# Altium footprint library IDETEC.PcbLib: 275 footprints (part 6 of 18)
Each footprint in its own frame and in the unit in brackets; x right, y up, seen from the top. Pads: shape width x height; smd on the part's side, far side on the other; paste and mask are expansions set on the pad; w line width, h text height; cw(c..) or ccw(c..) is an arc to the next point about the centre after c.
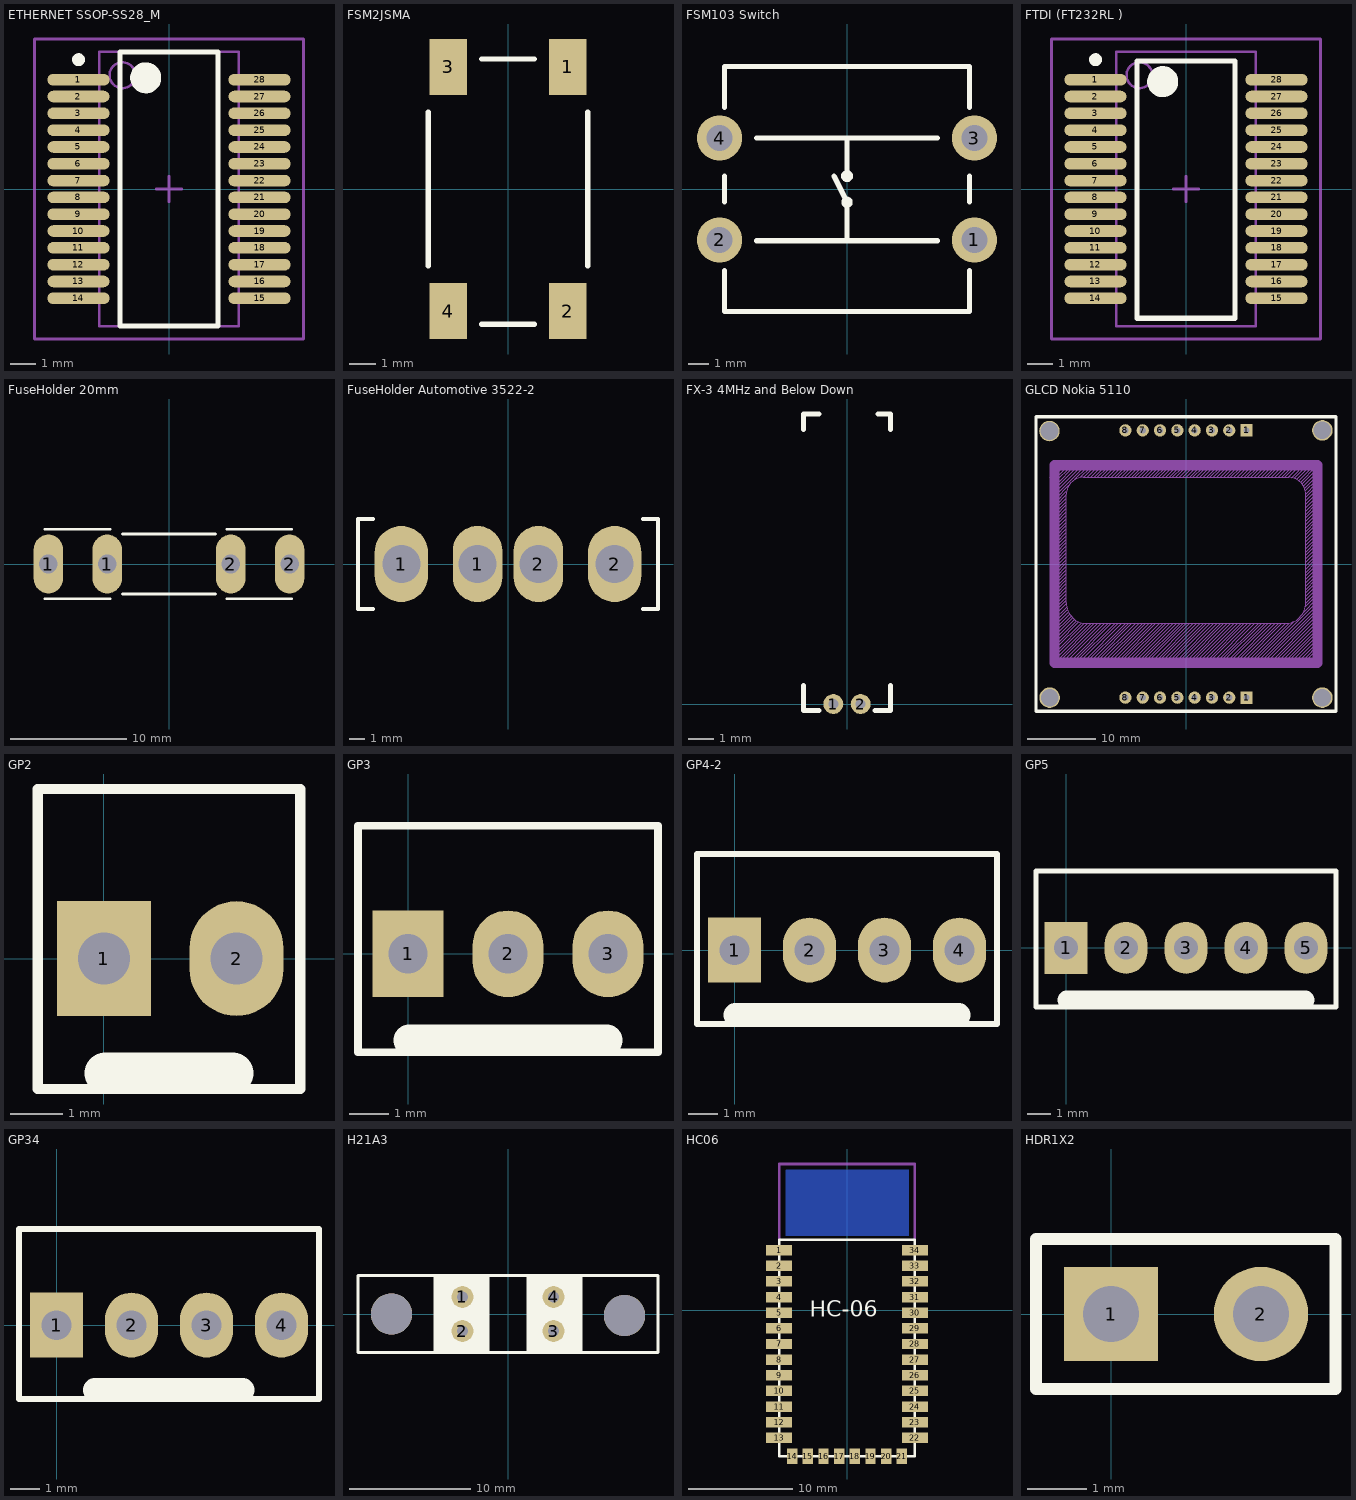
[diagram p5: the footprints below, top view; thin cyan lines are the x and y axes]

## ETHERNET SSOP-SS28_M [mm] "SOP, 28-Leads, Body 10.2x5.2mm, Pitch 0.65mm, IPC Low Density"
height 2
pads (28):
  oval 2.4x0.45 smd: 1(-3.5,4.225) 2(-3.5,3.575) 3(-3.5,2.925) 4(-3.5,2.275) 5(-3.5,1.625) 6(-3.5,0.975) 7(-3.5,0.325) 8(-3.5,-0.325) 9(-3.5,-0.975) 10(-3.5,-1.625) 11(-3.5,-2.275) 12(-3.5,-2.925) 13(-3.5,-3.575) 14(-3.5,-4.225) 15(3.5,-4.225) 16(3.5,-3.575) 17(3.5,-2.925) 18(3.5,-2.275) 19(3.5,-1.625) 20(3.5,-0.975) 21(3.5,-0.325) 22(3.5,0.325) 23(3.5,0.975) 24(3.5,1.625) 25(3.5,2.275) 26(3.5,2.925) 27(3.5,3.575) 28(3.5,4.225)
Top Overlay:
  circle w0.6: c-0.9,4.3 r0.3
  circle w0.25: c-3.5,5 r0.125
  lines w0.2: -1.9,-5.3 1.9,-5.3 1.9,5.3 -1.9,5.3 -1.9,-5.3
Mechanical 13:
  circle w0.1: c-1.8,4.4 r0.5
  lines w0.1: -2.7,-5.3 2.7,-5.3 2.7,5.3 -2.7,5.3 -2.7,-5.3
Mechanical 15:
  lines w0.1: -0.5,0 0.5,0 ; 0,-0.5 0,0.5 ; -5.2,-5.8 5.2,-5.8 5.2,5.8 -5.2,5.8 -5.2,-5.8
3D body: height 2, standoff 0, extent -2.7,-5.3 2.7,5.3

## FSM2JSMA [mm] "Micro Miniature Pushbutton Switch"
height 4.29
pads (4):
  rect 1.4x2.1 smd: 1(2.25,4.6) 2(2.25,-4.6) 3(-2.25,4.6) 4(-2.25,-4.6)
Top Overlay:
  lines w0.2: -3,-2.9 -3,2.9 ; -1,-5.1 1,-5.1 ; -1,4.9 1,4.9 ; 3,-2.9 3,2.9
3D body "Boton_SMD.STEP": height 4.38, standoff -0.01, extent -3,-5.1 3,4.9

## FSM103 Switch [mil] "Switch 12x12 mm, TycoElectronics"
height 286.61
pads (4):
  round 87 hole 51: 1(246.06,-98.43) 2(-246.06,-98.43) 3(246.06,98.43) 4(-246.06,98.43)
Top Overlay:
  circle w10: c0,-25.59 r5.99
  circle w10: c0,25 r6.5
  lines w10: -236.22,-157.48 -236.22,-236.22 236.22,-236.22 236.22,-157.48 ; -236.22,-25 -236.22,25 ; -236.22,157.48 -236.22,236.22 236.22,236.22 236.22,157.48 ; -175,-100 175,-100 ; -175,98.43 175,98.43 ; -25,25 0,-25 0,-100 ; 0,25 0,98.43 ; 236.22,-25 236.22,25
3D body "c-1437565-5-e-3d.STEP": height 289.76, standoff -134.65, extent -277.53,-236.21 277.53,236.23

## FTDI (FT232RL ) [mm] "SOP, 28-Leads, Body 10.2x5.2mm, Pitch 0.65mm, IPC Low Density"
height 2
pads (28):
  oval 2.4x0.45 smd: 1(-3.5,4.225) 2(-3.5,3.575) 3(-3.5,2.925) 4(-3.5,2.275) 5(-3.5,1.625) 6(-3.5,0.975) 7(-3.5,0.325) 8(-3.5,-0.325) 9(-3.5,-0.975) 10(-3.5,-1.625) 11(-3.5,-2.275) 12(-3.5,-2.925) 13(-3.5,-3.575) 14(-3.5,-4.225) 15(3.5,-4.225) 16(3.5,-3.575) 17(3.5,-2.925) 18(3.5,-2.275) 19(3.5,-1.625) 20(3.5,-0.975) 21(3.5,-0.325) 22(3.5,0.325) 23(3.5,0.975) 24(3.5,1.625) 25(3.5,2.275) 26(3.5,2.925) 27(3.5,3.575) 28(3.5,4.225)
Top Overlay:
  circle w0.25: c-3.5,5 r0.125
  circle w0.6: c-0.9,4.15 r0.3
  lines w0.2: -1.9,-5 -1.9,4.95 1.9,4.95 1.9,-5 -1.9,-5
Mechanical 13:
  circle w0.1: c-1.8,4.4 r0.5
  lines w0.1: -2.7,-5.3 -2.7,5.3 2.7,5.3 2.7,-5.3 -2.7,-5.3
Mechanical 15:
  lines w0.1: -0.5,0 0.5,0 ; 0,-0.5 0,0.5 ; -5.2,-5.8 -5.2,5.8 5.2,5.8 5.2,-5.8 -5.2,-5.8
3D body "User Library-SSOP-28-FT232RL.STEP": height 2.16, standoff 0, extent -3.853,-5.165 3.903,5.165

## FuseHolder 20mm [mm] "Portafusibles generico para Fusibles de vidrio 20mm"
pads (4):
  rrect100% 2.54x5.08 hole 1.6: 1(-10.414,0) 2(5.334,0) 2(10.414,0)
  oval 2.54x5.08 hole 1.6: 1(-5.334,0)
Top Overlay:
  lines w0.254: -10.7,-3 -5.1,-3 ; -10.7,3 -5.1,3 ; -4,-2.6 4,-2.6 ; 5,-3 10.6,-3 ; 5,3 10.6,3 ; -4,2.6 4,2.6 -4,2.6
3D body "FUSIVEL.STEP": height 10.37, standoff 5.37, extent -10,-2.5 10,2.5
3D body "FUSECLIP.STEP": height 10.96, standoff -3.46, extent 5.072,-3 10.676,2.982
3D body "FUSECLIP.STEP": height 10.96, standoff -3.46, extent -10.676,-2.982 -5.072,3

## FuseHolder Automotive 3522-2 [mil] "Keystone 3522-2"
height 299.21
pads (4):
  rrect100% 140x200 hole 100: 1(-280,0) 2(280,0)
  oval 130x200 hole 100: 1(-80,0)
  rrect100% 130x200 hole 100: 2(80,0)
Top Overlay:
  lines w10: -354.33,-118.11 -393.7,-118.11 -393.7,118.11 -354.33,118.11 ; 354.33,-118.11 393.7,-118.11 393.7,118.11 354.33,118.11
3D body "Keystone 3522-2.STEP": height 319.77, standoff -117.24, extent -379.91,-90.98 379.93,86.19

## FX-3 4MHz and Below Down [mm] "FOX Electronics, Micro Miniature \"AT STRIP\" Crystal 10.5 x Ø3.2mm"
height 3.2
pads (2):
  round 0.8 hole 0.4: 1(-0.55,0) 2(0.55,0)
Top Overlay:
  lines w0.2: -1.75,0.75 -1.75,-0.25 -1.125,-0.25 ; -1.75,11 -1.75,11.625 -1.125,11.625 ; 1.125,-0.25 1.75,-0.25 1.75,0.75 ; 1.25,11.625 1.75,11.625 1.75,11
3D body "FOX FX-3_4MHz and Below.STEP": height 3.2, standoff -5.4, extent -1.6,-0.16 1.6,11.5

## GLCD Nokia 5110 [mm] "lcd graficable de 84X48"
height 6
pads (20):
  rect 1.8x1.8 hole 0.9: 1(8.89,-19.6) 1(8.89,19.6)
  round 1.8 hole 0.9: 2(6.35,-19.6) 2(6.35,19.6) 3(3.81,-19.6) 3(3.81,19.6) 4(1.27,-19.6) 4(1.27,19.6) 5(-1.27,-19.6) 5(-1.27,19.6) 6(-3.81,-19.6) 6(-3.81,19.6) 7(-6.35,-19.6) 7(-6.35,19.6) 8(-8.89,-19.6) 8(-8.89,19.6)
  round 3 hole 2.6: ""(-20.025,19.496) ""(-20,-19.6) ""(20,19.6) ""(20,-19.6)
Top Overlay:
  lines w0.5: -22,-21.6 -22,21.6 22,21.6 22,-21.6 -22,-21.6
Mechanical 1:
  drawing of 285 lines, arcs and shapes, not listed
3D body "User Library-Header_Male_8Pin.STEP": height 3, standoff -8.54, extent -10.16,18.355 10.16,20.845
3D body "User Library-Header_Male_8Pin.STEP": height 3, standoff -8.54, extent -10.16,-20.845 10.16,-18.355
3D body "LCD Nokia5110.STEP": height 2, standoff -4.4, extent -22.501,-22.548 22.499,22.452

## GP2 [mm] "Connector; Header; 3 Position"
pads (2):
  rect 1.8x2.2 hole 1: 1(0,0)
  oval 1.8x2.2 hole 1: 2(2.54,0)
Top Overlay:
  lines w0.15: -0.048,-0.048 0,0
  lines w0.2: 0.03,-2.5 -1.27,-2.5 -1.27,3.25 3.762,3.25 3.762,-2.5 2.462,-2.5
  lines w0.8: 0.03,-2.199 2.462,-2.199
3D body "SW3dPS-molex kk 0_1in latching 2 way vertical header.STEP": height 12.1, standoff -3.14, extent -1.306,-2.856 3.774,2.986

## GP3 [mm] "Connector; Header; 3 Position"
height 9
pads (3):
  rect 1.8x2.2 hole 1: 1(0,0)
  oval 1.8x2.2 hole 1: 2(2.54,0) 3(5.08,0)
Top Overlay:
  lines w0.2: 0.03,-2.5 -1.27,-2.5 -1.27,3.25 6.35,3.25 6.35,-2.5 5.045,-2.5
  lines w0.8: 0.03,-2.199 5.045,-2.199
3D body "022272031.stp": height 11.72, standoff -3.54, extent -1.295,-2.855 6.325,2.945

## GP4-2 [mm] "Connector; Header; 4 Position"
pads (4):
  rect 1.8x2.2 hole 1: 1(0,0)
  oval 1.8x2.2 hole 1: 2(2.54,0) 3(5.08,0) 4(7.62,0)
Top Overlay:
  lines w0.2: 0.03,-2.5 -1.27,-2.5 -1.27,3.25 8.89,3.25 8.89,-2.5 7.59,-2.5
  lines w0.8: 0.031,-2.2 7.591,-2.2
3D body "022272031.stp": height 11.72, standoff -3.54, extent -1.259,-2.92 6.361,2.88
3D body "022272031.stp": height 11.72, standoff -3.54, extent 1.282,-2.92 8.902,2.88

## GP5 [mm] "Connector; Header; 5 Position"
pads (5):
  rect 1.8x2.2 hole 1: 1(0,0)
  oval 1.8x2.2 hole 1: 2(2.54,0) 3(5.08,0) 4(7.62,0) 5(10.16,0)
Top Overlay:
  lines w0.2: 0.03,-2.5 -1.27,-2.5 -1.27,3.25 11.43,3.25 11.43,-2.5 10.13,-2.5
  lines w0.8: 0.03,-2.199 10.13,-2.199
3D body "022272031.stp": height 11.72, standoff -3.54, extent 1.282,-2.92 8.902,2.88
3D body "022272031.stp": height 11.72, standoff -3.54, extent -1.259,-2.92 6.361,2.88
3D body "022272031.stp": height 11.72, standoff -3.54, extent 3.822,-2.92 11.442,2.88

## GP34 [mm] "Connector; Header; 4 Position"
pads (4):
  rect 1.8x2.2 hole 1: 1(0,0)
  oval 1.8x2.2 hole 1: 2(2.54,0) 3(5.08,0) 4(7.62,0)
Top Overlay:
  lines w0.2: 2.875,-2.5 -1.27,-2.5 -1.27,3.25 8.89,3.25 8.89,-2.5 5.045,-2.5
  lines w0.8: 1.296,-2.2 6.312,-2.2
3D body "SW3dPS-molex kk 0_1in latching 4 way vertical header.STEP": height 11.8, standoff -3.44, extent -1.27,-2.87 8.89,2.972

## H21A3 [mm] "PHOTOTRANSISTOR OPTICAL INTERRUPTER SWITCH"
height 1.1
pads (6):
  round 1.8 hole 0.9: 1(-3.75,1.4) 2(-3.75,-1.4) 3(3.75,-1.4) 4(3.75,1.4)
  round 3.4 hole 3.4: ""(-9.6,0) ""(9.6,-0.127)
Top Overlay:
  rectangle: -6,-3.175 -1.65,3.175
  rectangle: 1.65,-3.175 6,3.175
  lines w0.254: -6,-3.175 -6,3.175 ; -1.65,-3.175 -1.65,3.175 ; 1.65,-3.175 1.65,3.175 ; 6,-3.175 6,3.175 ; -12.35,-3.175 12.35,-3.175 12.35,3.175 -12.35,3.175 -12.35,-3.175
3D body "User Library-Sharp_GP1S58VJ000F.STEP": height 10.7, standoff -12.3, extent -7.05,-2.625 6.95,2.575

## HC06 [mm] "HC06"
pads (34):
  rect 2.5x1 smd: 1(-6.5,5.75) 2(-6.5,4.25) 3(-6.5,2.75) 4(-6.5,1.25) 5(-6.5,-0.25) 6(-6.5,-1.75) 7(-6.5,-3.25) 8(-6.5,-4.75) 9(-6.5,-6.25) 10(-6.5,-7.75) 11(-6.5,-9.25) 12(-6.5,-10.75) 13(-6.5,-12.25) 22(6.5,-12.25) 23(6.5,-10.75) 24(6.5,-9.25) 25(6.5,-7.75) 26(6.5,-6.25) 27(6.5,-4.75) 28(6.5,-3.25) 29(6.5,-1.75) 30(6.5,-0.25) 31(6.5,1.25) 32(6.5,2.75) 33(6.5,4.25) 34(6.5,5.75)
  rect 1x1.5 smd: 14(-5.25,-14) 15(-3.75,-14) 16(-2.25,-14) 17(-0.75,-14) 18(0.75,-14) 19(2.25,-14) 20(3.75,-14) 21(5.25,-14)
Bottom Layer:
  rectangle: -5.9,7.081 5.925,13.45
Top Overlay:
  lines w0.254: -6.5,-14 -6.5,6.731 6.5,6.731 6.5,-14 -6.5,-14
  text "HC-06" at -3.556,-0.635 h1.52
Mechanical 1:
  lines w0.254: -6.5,6.731 -6.5,14 0.8,14 ; 0.769,14 6.5,14 6.5,6.731
3D body "User Library-Bluetooth HC-06_.STEP": height 2.35, standoff 0, extent -7.009,-14.017 7.011,13.993

## HDR1X2 [mm] "Connector; Header; 2 Position"
height 2
pads (2):
  rect 1.6x1.6 hole 0.95: 1(0,0)
  round 1.6 hole 0.95: 2(2.54,0)
Top Overlay:
  lines w0.15: 3.81,-1.27 3.81,0
  lines w0.2: -1.27,-1.27 3.799,-1.27 3.799,1.27 -1.27,1.27 -1.27,-1.27
3D body "User Library-Header1x2.STEP": height 8.49, standoff -2.49, extent -1.345,-1.328 3.735,1.212